# Altium footprint library micromatch.PcbLib: 14 footprints
Each footprint in its own frame and in the unit in brackets; x right, y up, seen from the top. Pads: shape width x height; smd on the part's side, far side on the other; paste and mask are expansions set on the pad; w line width, h text height; cw(c..) or ccw(c..) is an arc to the next point about the centre after c.
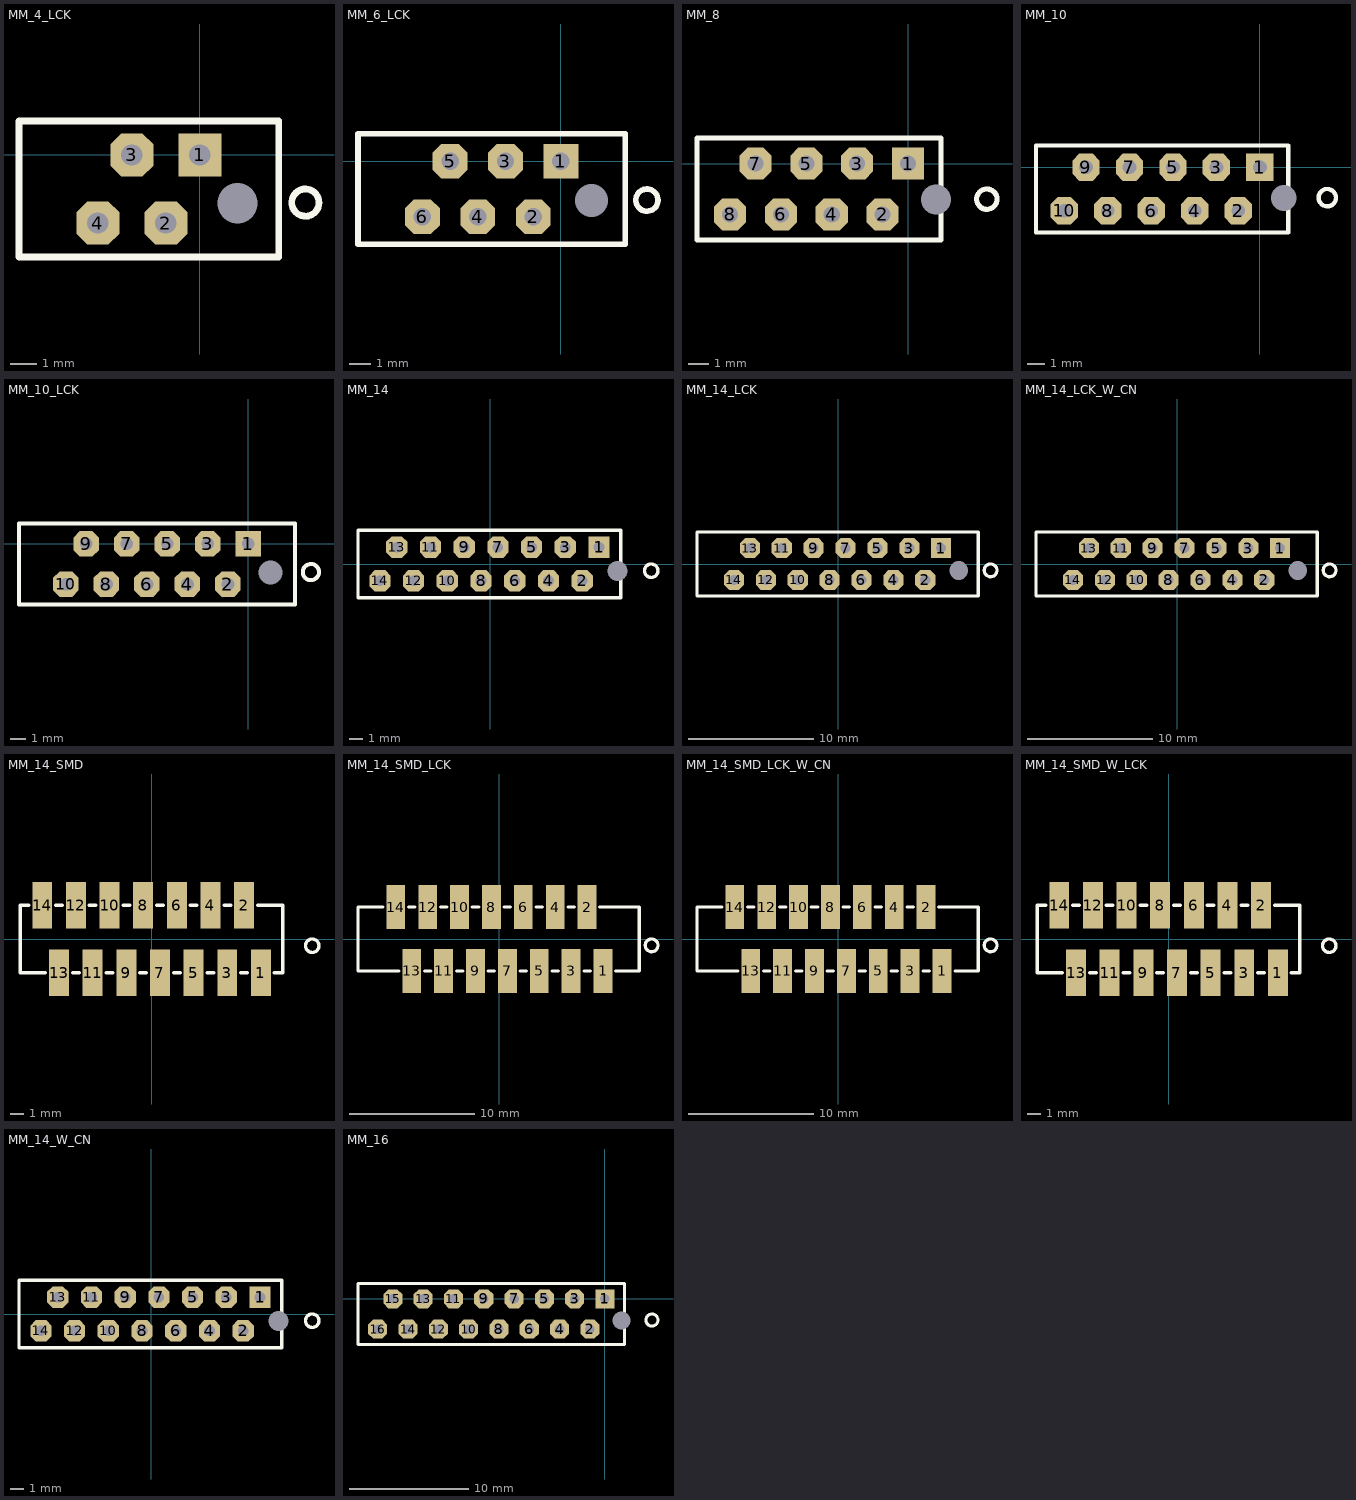
[diagram p0: the footprints below, top view; thin cyan lines are the x and y axes]

## MM_4_LCK [mm] "Wurth Elektronik 690367191072 4pin 2.54"
height 4
pads (5):
  oct 0x0 hole 1.5: 0(1.4,-1.8)
  rect 1.6x1.6 hole 0.8: 1(0,0)
  oct 1.6x1.6 hole 0.8: 2(-1.27,-2.54) 3(-2.54,0) 4(-3.81,-2.54)
Top Overlay:
  circle w0.254: c3.937,-1.778 r0.508
  lines w0.254: -6.755,-3.81 2.945,-3.81 2.945,1.27 -6.755,1.27 -6.755,-3.81
3D body "micro_miniature_connector_a-32-04v-130xl.stp": height 4.2, standoff -2.9, extent -6.753,-3.77 2.921,1.23

## MM_6_LCK [mm] "Wurth Elektronik 690367191072 6pin 2.54"
height 4
pads (7):
  oct 0x0 hole 1.5: 0(1.4,-1.8)
  rect 1.6x1.6 hole 0.8: 1(0,0)
  oct 1.6x1.6 hole 0.8: 2(-1.27,-2.54) 3(-2.54,0) 4(-3.81,-2.54) 5(-5.08,0) 6(-6.35,-2.54)
Top Overlay:
  circle w0.254: c3.937,-1.778 r0.508
  lines w0.254: -9.295,-3.81 -9.295,1.27 2.945,1.27 2.945,-3.81 -9.295,-3.81
3D body "micro_miniature_connector_a-32-06v-130xl.stp": height 4.2, standoff -2.9, extent -9.293,-3.77 2.921,1.23

## MM_8 [mm] "Tyco Micro-Match, 8 Pin"
height 4.1
pads (9):
  round 0 hole 1.5: 0(1.4,-1.8)
  rect 1.6x1.6 hole 0.8: 1(0,0)
  oct 1.6x1.6 hole 0.8: 2(-1.27,-2.54) 3(-2.54,0) 4(-3.81,-2.54) 5(-5.08,0) 6(-6.35,-2.54) 7(-7.62,0) 8(-8.89,-2.54)
Top Overlay:
  circle w0.254: c3.937,-1.778 r0.508
  lines w0.254: -10.541,-3.81 -10.541,1.27 1.651,1.27 1.651,-3.81 -10.541,-3.81
3D body "micro_miniature_connector_a-32-08v-130x0.stp": height 4.2, standoff -2.9, extent -10.525,-3.77 1.635,1.23

## MM_10 [mm] "Tyco Micro-Match, 10 Pin"
height 4.1
pads (11):
  round 0 hole 1.5: 0(1.4,-1.8)
  rect 1.6x1.6 hole 0.8: 1(0,0)
  oct 1.6x1.6 hole 0.8: 2(-1.27,-2.54) 3(-2.54,0) 4(-3.81,-2.54) 5(-5.08,0) 6(-6.35,-2.54) 7(-7.62,0) 8(-8.89,-2.54) 9(-10.16,0) 10(-11.43,-2.54)
Top Overlay:
  circle w0.254: c3.937,-1.778 r0.508
  lines w0.254: -13.081,-3.81 -13.081,1.27 1.651,1.27 1.651,-3.81 -13.081,-3.81
3D body "micro_miniature_connector_a-32-10v-130x0.stp": height 4.2, standoff -2.9, extent -13.065,-3.77 1.635,1.23

## MM_10_LCK [mm] "Wurth Elektronik 690367191072 10pin 2.54"
height 4
pads (11):
  oct 0x0 hole 1.5: 0(1.4,-1.8)
  rect 1.6x1.6 hole 0.8: 1(0,0)
  oct 1.6x1.6 hole 0.8: 2(-1.27,-2.54) 3(-2.54,0) 4(-3.81,-2.54) 5(-5.08,0) 6(-6.35,-2.54) 7(-7.62,0) 8(-8.89,-2.54) 9(-10.16,0) 10(-11.43,-2.54)
Top Overlay:
  circle w0.254: c3.937,-1.778 r0.508
  lines w0.254: -14.375,-3.81 -14.375,1.27 2.945,1.27 2.945,-3.81 -14.375,-3.81
3D body "micro_miniature_connector_a-32-10v-130xl.stp": height 4.2, standoff -2.9, extent -14.489,-3.77 2.805,1.23

## MM_14 [mm] "16 Pin MicroMatch Connector Without Lock: TE-CONNECTIVITY 8-215079-4 or AMPHENOL TMM-4-0-14-2"
height 4.1
pads (15):
  round 0 hole 1.5: 0(9.59,-0.53)
  rect 1.6x1.6 hole 0.8: 1(8.19,1.27)
  oct 1.6x1.6 hole 0.8: 2(6.92,-1.27) 3(5.65,1.27) 4(4.38,-1.27) 5(3.11,1.27) 6(1.84,-1.27) 7(0.57,1.27) 8(-0.7,-1.27) 9(-1.97,1.27) 10(-3.24,-1.27) 11(-4.51,1.27) 12(-5.78,-1.27) 13(-7.05,1.27) 14(-8.32,-1.27)
Top Overlay:
  circle w0.254: c12.127,-0.508 r0.508
  lines w0.254: -9.971,-2.54 -9.971,2.54 9.841,2.54 9.841,-2.54 -9.971,-2.54
3D body "micro_miniature_connector_a-32-14v-130x0.stp": height 4.2, standoff -2.9, extent -9.955,-2.5 9.825,2.5

## MM_14_LCK [mm] "16 Pin MicroMatch Connector With Lock: AMPHENOL TMM-4-L-14-2"
height 4.1
pads (15):
  round 0 hole 1.5: 0(9.59,-0.53)
  rect 1.6x1.6 hole 0.8: 1(8.19,1.27)
  oct 1.6x1.6 hole 0.8: 2(6.92,-1.27) 3(5.65,1.27) 4(4.38,-1.27) 5(3.11,1.27) 6(1.84,-1.27) 7(0.57,1.27) 8(-0.7,-1.27) 9(-1.97,1.27) 10(-3.24,-1.27) 11(-4.51,1.27) 12(-5.78,-1.27) 13(-7.05,1.27) 14(-8.32,-1.27)
Top Overlay:
  circle w0.254: c12.127,-0.508 r0.508
  lines w0.254: -11.265,-2.54 11.135,-2.54 11.135,2.54 -11.265,2.54 -11.265,-2.54
3D body "micro_miniature_connector_a-32-14v-130xl.stp": height 4.2, standoff -2.9, extent -11.187,-2.5 11.187,2.5

## MM_14_LCK_W_CN [mm] "16 Pin MicroMatch Connector With Lock: AMPHENOL TMM-4-L-14-2"
height 4.1
pads (15):
  round 0 hole 1.5: 0(9.59,-0.53)
  rect 1.6x1.6 hole 0.8: 1(8.19,1.27)
  oct 1.6x1.6 hole 0.8: 2(6.92,-1.27) 3(5.65,1.27) 4(4.38,-1.27) 5(3.11,1.27) 6(1.84,-1.27) 7(0.57,1.27) 8(-0.7,-1.27) 9(-1.97,1.27) 10(-3.24,-1.27) 11(-4.51,1.27) 12(-5.78,-1.27) 13(-7.05,1.27) 14(-8.32,-1.27)
Top Overlay:
  circle w0.254: c12.127,-0.508 r0.508
  lines w0.254: -11.265,-2.54 -11.265,2.54 11.135,2.54 11.135,-2.54 -11.265,-2.54
3D body "c-1-215083-4-u-3d.stp": height 7.4, standoff -0.95, extent -10.58,-2.5 10.58,2.5
3D body "micro_miniature_connector_a-32-14v-130xl.stp": height 4.2, standoff -2.9, extent -11.252,-2.5 11.122,2.5

## MM_14_SMD [mm] "16 Pin MicroMatch Connector Without Lock"
height 4.1
pads (14):
  rect 1.5x3.5 smd: 1(8.255,-2.54) 2(6.985,2.54) 3(5.715,-2.54) 4(4.445,2.54) 5(3.175,-2.54) 6(1.905,2.54) 7(0.635,-2.54) 8(-0.635,2.54) 9(-1.905,-2.54) 10(-3.175,2.54) 11(-4.445,-2.54) 12(-5.715,2.54) 13(-6.985,-2.54) 14(-8.255,2.54)
Top Overlay:
  circle w0.254: c12.127,-0.508 r0.508
  lines w0.254: -9.906,-2.54 -8.001,-2.54 ; -9.9,-2.54 -9.9,2.54 -9.271,2.54 ; -7.239,2.54 -6.731,2.54 ; -5.969,-2.54 -5.461,-2.54 ; -4.699,2.54 -4.191,2.54 ; -3.429,-2.54 -2.921,-2.54 ; -2.159,2.54 -1.651,2.54 ; -0.889,-2.54 -0.381,-2.54 ; 0.381,2.54 0.889,2.54 ; 1.651,-2.54 2.159,-2.54 ; 2.921,2.54 3.429,2.54 ; 4.191,-2.54 4.699,-2.54 ; 5.461,2.54 5.969,2.54 ; 6.731,-2.54 7.239,-2.54 ; 8.001,2.54 9.9,2.54 9.9,-2.54 9.271,-2.54
3D body "c-1-188275-4-u-3d.stp": height 5.3, standoff 0.05, extent -9.855,-3.45 9.855,3.45

## MM_14_SMD_LCK [mm] "16 Pin MicroMatch Connector With Lock"
height 4.1
pads (14):
  rect 1.5x3.5 smd: 1(8.255,-2.54) 2(6.985,2.54) 3(5.715,-2.54) 4(4.445,2.54) 5(3.175,-2.54) 6(1.905,2.54) 7(0.635,-2.54) 8(-0.635,2.54) 9(-1.905,-2.54) 10(-3.175,2.54) 11(-4.445,-2.54) 12(-5.715,2.54) 13(-6.985,-2.54) 14(-8.255,2.54)
Top Overlay:
  circle w0.254: c12.127,-0.508 r0.508
  lines w0.254: -9.271,2.54 -11.265,2.54 -11.265,-2.54 -8.001,-2.54 ; -7.239,2.54 -6.731,2.54 ; -5.969,-2.54 -5.461,-2.54 ; -4.699,2.54 -4.191,2.54 ; -3.429,-2.54 -2.921,-2.54 ; -2.159,2.54 -1.651,2.54 ; -0.889,-2.54 -0.381,-2.54 ; 0.381,2.54 0.889,2.54 ; 1.651,-2.54 2.159,-2.54 ; 2.921,2.54 3.429,2.54 ; 4.191,-2.54 4.699,-2.54 ; 5.461,2.54 5.969,2.54 ; 6.731,-2.54 7.239,-2.54 ; 8.001,2.54 11.135,2.54 11.135,-2.54 9.271,-2.54
3D body "c-8-338069-4-k-3d.stp": height 5.3, standoff 0.01, extent -11.125,-3.454 11.125,3.465

## MM_14_SMD_LCK_W_CN [mm] "16 Pin MicroMatch Connector With Lock"
height 4.1
pads (14):
  rect 1.5x3.5 smd: 1(8.255,-2.54) 2(6.985,2.54) 3(5.715,-2.54) 4(4.445,2.54) 5(3.175,-2.54) 6(1.905,2.54) 7(0.635,-2.54) 8(-0.635,2.54) 9(-1.905,-2.54) 10(-3.175,2.54) 11(-4.445,-2.54) 12(-5.715,2.54) 13(-6.985,-2.54) 14(-8.255,2.54)
Top Overlay:
  circle w0.254: c12.127,-0.508 r0.508
  lines w0.254: -9.271,2.54 -11.265,2.54 -11.265,-2.54 -8.001,-2.54 ; -7.239,2.54 -6.731,2.54 ; -5.969,-2.54 -5.461,-2.54 ; -4.699,2.54 -4.191,2.54 ; -3.429,-2.54 -2.921,-2.54 ; -2.159,2.54 -1.651,2.54 ; -0.889,-2.54 -0.381,-2.54 ; 0.381,2.54 0.889,2.54 ; 1.651,-2.54 2.159,-2.54 ; 2.921,2.54 3.429,2.54 ; 4.191,-2.54 4.699,-2.54 ; 5.461,2.54 5.969,2.54 ; 6.731,-2.54 7.239,-2.54 ; 8.001,2.54 11.135,2.54 11.135,-2.54 9.277,-2.54
3D body "c-8-338069-4-k-3d.stp": height 5.3, standoff 0.01, extent -11.125,-3.454 11.125,3.465
3D body "c-1-215083-4-u-3d.stp": height 8.5, standoff 0.15, extent -10.58,-2.5 10.58,2.5

## MM_14_SMD_W_LCK [mm] "16 Pin MicroMatch Connector Without Lock"
height 4.1
pads (14):
  rect 1.5x3.5 smd: 1(8.255,-2.54) 2(6.985,2.54) 3(5.715,-2.54) 4(4.445,2.54) 5(3.175,-2.54) 6(1.905,2.54) 7(0.635,-2.54) 8(-0.635,2.54) 9(-1.905,-2.54) 10(-3.175,2.54) 11(-4.445,-2.54) 12(-5.715,2.54) 13(-6.985,-2.54) 14(-8.255,2.54)
Top Overlay:
  circle w0.254: c12.127,-0.508 r0.508
  lines w0.254: -9.906,-2.54 -8.001,-2.54 ; -9.9,-2.54 -9.9,2.54 -9.271,2.54 ; -7.239,2.54 -6.731,2.54 ; -5.969,-2.54 -5.461,-2.54 ; -4.699,2.54 -4.191,2.54 ; -3.429,-2.54 -2.921,-2.54 ; -2.159,2.54 -1.651,2.54 ; -0.889,-2.54 -0.381,-2.54 ; 0.381,2.54 0.889,2.54 ; 1.651,-2.54 2.159,-2.54 ; 2.921,2.54 3.429,2.54 ; 4.191,-2.54 4.699,-2.54 ; 5.461,2.54 5.969,2.54 ; 6.731,-2.54 7.239,-2.54 ; 8.001,2.54 9.9,2.54 9.9,-2.54 9.271,-2.54
3D body "c-1-215083-4-u-3d.stp": height 8.5, standoff 0.15, extent -10.58,-2.5 10.58,2.5
3D body "c-1-188275-4-u-3d.stp": height 5.3, standoff 0.05, extent -9.855,-3.45 9.855,3.45

## MM_14_W_CN [mm] "16 Pin MicroMatch Connector Without Lock: TE-CONNECTIVITY 8-215079-4 or AMPHENOL TMM-4-0-14-2"
height 4.1
pads (15):
  round 0 hole 1.5: 0(9.59,-0.53)
  rect 1.6x1.6 hole 0.8: 1(8.19,1.27)
  oct 1.6x1.6 hole 0.8: 2(6.92,-1.27) 3(5.65,1.27) 4(4.38,-1.27) 5(3.11,1.27) 6(1.84,-1.27) 7(0.57,1.27) 8(-0.7,-1.27) 9(-1.97,1.27) 10(-3.24,-1.27) 11(-4.51,1.27) 12(-5.78,-1.27) 13(-7.05,1.27) 14(-8.32,-1.27)
Top Overlay:
  circle w0.254: c12.127,-0.508 r0.508
  lines w0.254: -9.971,-2.54 9.841,-2.54 9.841,2.54 -9.971,2.54 -9.971,-2.54
3D body "micro_miniature_connector_a-32-14v-130x0.stp": height 4.2, standoff -2.9, extent -9.89,-2.5 9.89,2.5
3D body "c-1-215083-4-u-3d.stp": height 7.4, standoff -0.95, extent -10.645,-2.5 10.515,2.5

## MM_16 [mm] "16 Pin MicroMatch Connector Without Lock: TE-CONNECTIVITY 1-215079-6 or AMPHENOL TMM-4-0-16-2"
height 4.1
pads (17):
  round 0 hole 1.5: 0(1.4,-1.8)
  rect 1.6x1.6 hole 0.8: 1(0,0)
  oct 1.6x1.6 hole 0.8: 2(-1.27,-2.54) 3(-2.54,0) 4(-3.81,-2.54) 5(-5.08,0) 6(-6.35,-2.54) 7(-7.62,0) 8(-8.89,-2.54) 9(-10.16,0) 10(-11.43,-2.54) 11(-12.7,0) 12(-13.97,-2.54) 13(-15.24,0) 14(-16.51,-2.54) 15(-17.78,0) 16(-19.05,-2.54)
Top Overlay:
  circle w0.254: c3.937,-1.778 r0.508
  lines w0.254: -20.701,-3.81 -20.701,1.27 1.651,1.27 1.651,-3.81 -20.701,-3.81
3D body "micro_miniature_connector_a-32-16v-130x0.stp": height 4.2, standoff -2.9, extent -20.685,-3.77 1.635,1.23